# Altium footprint library Custom_Library.PcbLib: 221 footprints (part 4 of 14)
Each footprint in its own frame and in the unit in brackets; x right, y up, seen from the top. Pads: shape width x height; smd on the part's side, far side on the other; paste and mask are expansions set on the pad; w line width, h text height; cw(c..) or ccw(c..) is an arc to the next point about the centre after c.
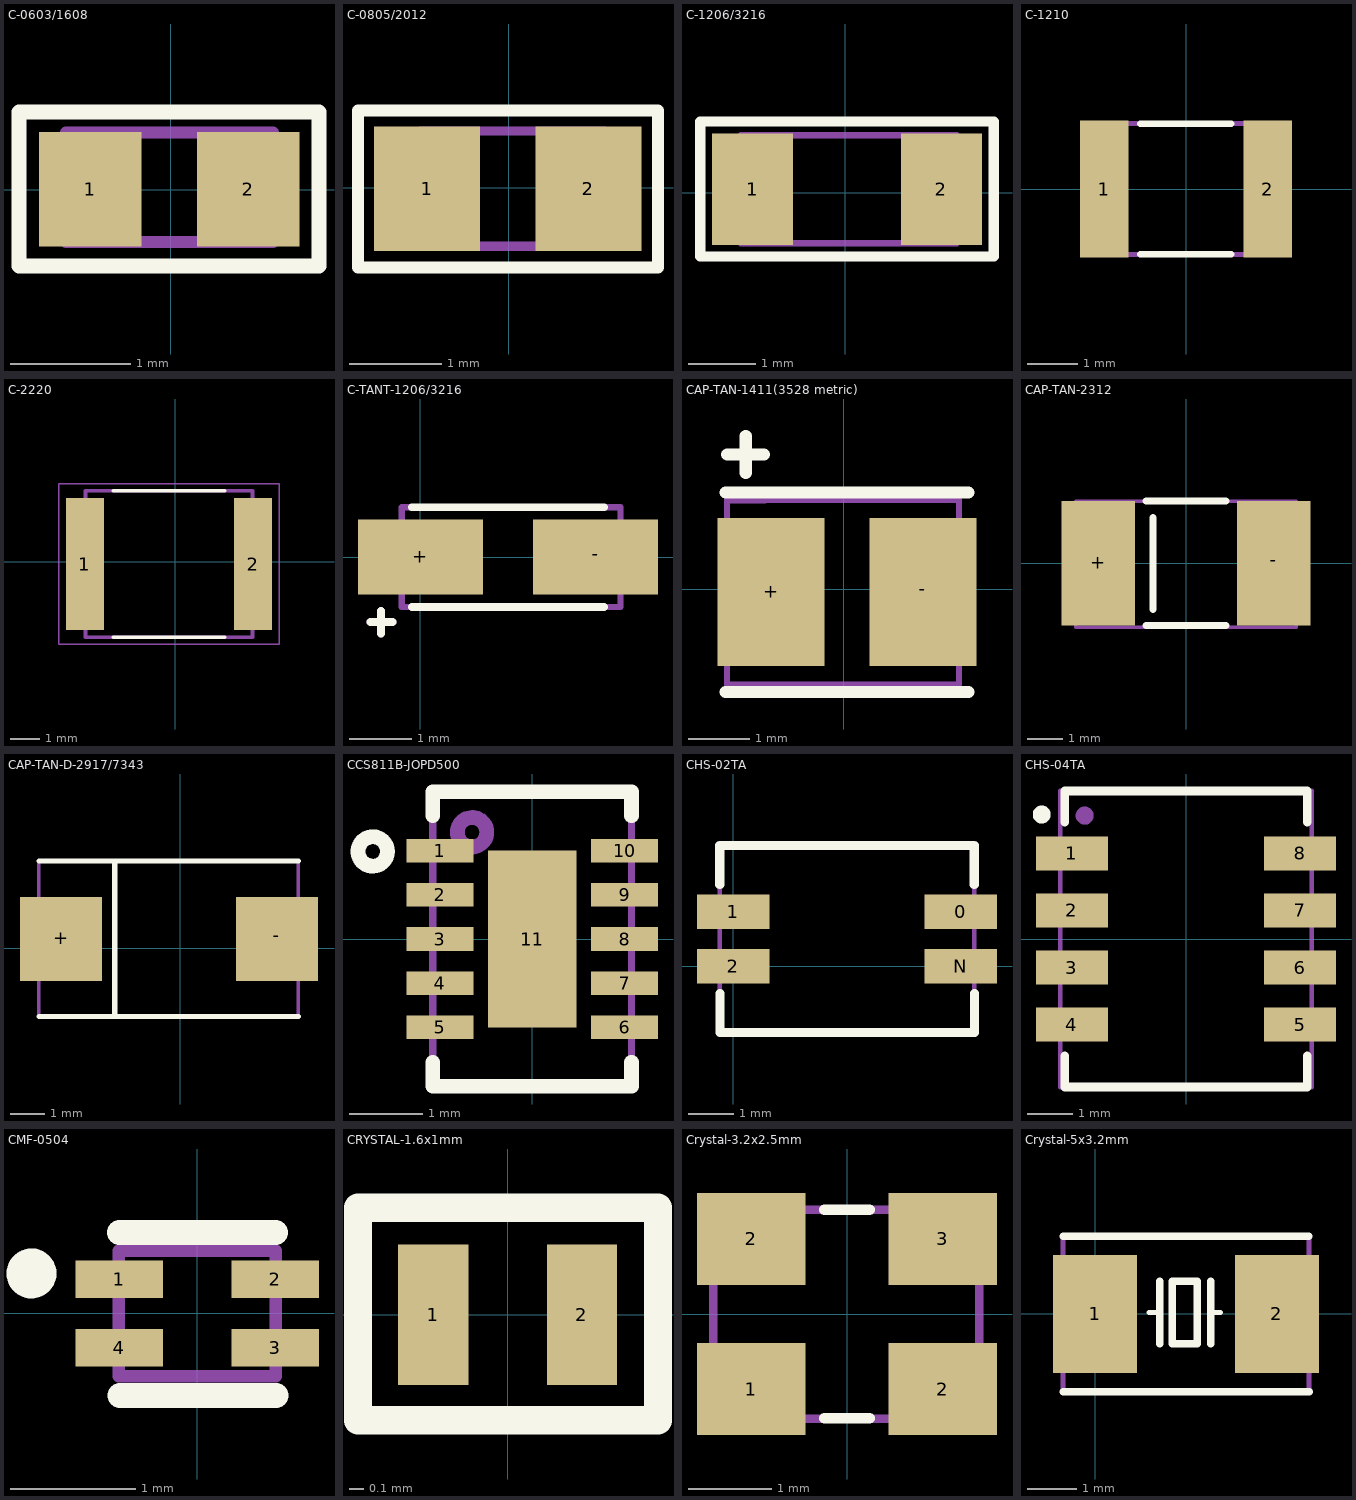
[diagram p3: the footprints below, top view; thin cyan lines are the x and y axes]

## C-0603/1608 [mm] "Chip Capacitor, 2-Leads, Body 1.60x0.80mm, IPC Medium Density"
height 0.89
pads (2):
  rect 0.85x0.95 smd: 1(-0.667,0.005) 2(0.643,0.005)
Top Overlay:
  lines w0.127: -1.258,-0.631 -1.258,0.645 1.23,0.645 1.23,-0.631 -1.258,-0.631
Top Assembly:
  lines w0.1: -0.868,-0.431 0.85,-0.431 0.85,0.475 -0.809,0.475 -0.868,0.475 -0.868,-0.431
  text "'.Designator'" at -3.12,-1.838 h1.27
3D body "0603 cap.STEP": height 0.82, standoff 0, extent -0.803,-0.402 0.797,0.422

## C-0805/2012 [mm] "Chip Capacitor, 2-Leads, Body 2.00x1.20mm, IPC Medium Density"
height 1.15
pads (2):
  rect 1.15x1.35 smd: 1(-0.883,-0.009) 2(0.867,-0.009)
Top Overlay:
  lines w0.127: -1.632,-0.864 1.621,-0.864 1.621,0.838 -1.632,0.838 -1.632,-0.633 -1.632,-0.864
Top Assembly:
  lines w0.1: -0.958,-0.634 1.042,-0.634 1.042,0.616 -0.958,0.616 -0.958,-0.634
  text "'.Designator'" at -2.987,-1.896 h1.27
3D body "0805 cap.STEP": height 1.26, standoff -0.02, extent -1.02,-0.644 0.98,0.63

## C-1206/3216 [mm] "Chip Capacitor, 2-Leads, Body 3.25x1.60mm, IPC Medium Density"
height 1.6
pads (2):
  rect 1.2x1.65 smd: 1(-1.373,0.055) 2(1.427,0.055)
Top Overlay:
  lines w0.15: -2.15,-0.94 -2.15,0.714 -2.15,1.058 2.203,1.058 2.203,-0.94 -2.15,-0.94
Top Assembly:
  lines w0.1: -1.548,-0.745 -1.548,0.855 1.652,0.855 1.652,-0.745 -1.548,-0.745
  text "'.Designator'" at -3.2,1.45 h1.27
3D body "1206 cap.STEP": height 1.62, standoff 0, extent -1.59,-0.762 1.61,0.862

## C-1210 [mm]
pads (2):
  rect 0.96x2.72 smd: 1(-1.625,0) 2(1.625,0)
Top Overlay:
  lines w0.127: -0.914,-1.3 0.599,-1.3 0.9,-1.3 ; -0.914,1.3 0.9,1.3
Top Assembly:
  lines w0.1: -1.7,-1.3 -1.7,1.3 -1,1.3 1.7,1.3 1.7,-1.3 -1.7,-1.3
  text "'.Designator'" at -3.356,-2.788 h1.27
3D body "CAP1210.STEP": height 1.5, standoff 0, extent -1.7,-1.3 1.7,1.3

## C-2220 [mm]
pads (2):
  rect 1.3x4.5 smd: 1(-3.087,-0.081) 2(2.663,-0.081)
Top Overlay:
  lines w0.127: -2.117,-2.581 1.693,-2.581 ; -2.117,2.419 1.693,2.419
Mechanical 13:
  lines w0.127: -3.062,-2.581 2.638,-2.581 2.638,2.419 -3.062,2.419 -3.062,-2.581
Mechanical 15:
  lines w0.05: -3.987,-2.831 3.563,-2.831 3.563,2.669 -3.987,2.669 -3.987,-2.831
3D body "step_temp.STEP": height 2.5, standoff 0, extent -3.062,-2.581 2.638,2.419

## C-TANT-1206/3216 [mm]
pads (2):
  rect 2x1.2 smd: +(0,0) -(2.8,0)
Top Overlay:
  lines w0.127: -0.8,-1.04 -0.45,-1.04 ; -0.63,-1.22 -0.63,-0.86 ; -0.135,-0.798 2.935,-0.798 ; -0.135,0.798 2.935,0.798
Top Assembly:
  lines w0.1: -0.3,-0.8 3.2,-0.8 3.2,0.8 -0.3,0.8 -0.3,-0.8
  lines w0.127: -0.8,-1.04 -0.45,-1.04 ; -0.63,-1.22 -0.63,-0.86
  text "'.Designator'" at -1.602,-2.541 h1.27
3D body "tantalum 10uF.stp": height 1.6, standoff -0.1, extent -0.25,-0.78 3.15,0.82

## CAP-TAN-1411(3528 metric) [mil]
pads (2):
  rect 68.44x95 smd: +(-46.73,-1.81) -(50.83,-1.81)
Top Overlay:
  lines w7.87: -75.95,-65.81 80.05,-65.81 ; -75.95,62.19 80.05,62.19 ; -74.8,86.61 -51.18,86.61 ; -62.99,74.8 -62.99,98.43
Top Assembly:
  lines w3.94: -74.89,54.05 -74.89,57.2 -50.76,57.2 -50.67,57.28 73.86,57.28 73.86,-31.08 73.86,-61.11 -16.8,-61.11 -16.89,-61.02 -74.89,-61.02 -74.89,55.03 ; -58.55,-1.81 -34.92,-1.81 ; -46.73,-13.62 -46.73,10
  text "'.Designator'" at -119.5,-119.24 h50
3D body: height 10, standoff 0, extent 2.05,-1.81 12.05,8.19
3D body "TCJB_AVX.step": height 85, standoff 0, extent -72.99,-60.59 72.99,57.44

## CAP-TAN-2312 [mm]
pads (2):
  rect 2.07x3.51 smd: +(-2.471,0) -(2.471,0)
Top Overlay:
  lines w0.2: -1.12,-1.75 1.12,-1.75 ; -1.12,1.75 1.12,1.75 ; -0.932,-1.307 -0.932,1.293
Top Assembly:
  lines w0.1: -1.257,1.742 3.1,1.742 3.1,-1.8 -3.1,-1.8 -3.1,1.742 -1.2,1.742
  text "'.Designator'" at -3.022,-3.609 h1.27
3D body "t491c106m025at.stp": height 2.81, standoff 0.01, extent -3.126,-1.746 3.174,1.754

## CAP-TAN-D-2917/7343 [mm]
pads (2):
  rect 2.37x2.43 smd mask+0.05: +(-3.44,0.27) -(2.8,0.27)
Top Overlay:
  lines w0.15: -4.08,-1.97 3.42,-1.97 ; -4.08,2.52 3.42,2.52 ; -1.89,-1.95 -1.89,2.52 -1.79,2.52
Top Assembly:
  lines w0.1: -4.09,-1.98 -4.09,2.52 3.41,2.52 3.41,-1.98 -4.04,-1.98 ; -3.75,0.31 -3.27,0.31 ; -3.51,0.07 -3.51,0.56
  text "'.Designator'" at -3.57,-3.19 h1.27
3D body "CAPM-TANTD-YL.STEP": height 3.11, standoff 0, extent -4.09,-1.98 3.41,2.52

## CCS811B-JOPD500 [mm]
pads (11):
  rect 0.91x0.32 smd: 1(-1.255,1.2) 2(-1.255,0.6) 3(-1.255,0) 4(-1.255,-0.6) 5(-1.255,-1.2) 6(1.255,-1.2) 7(1.255,-0.6) 8(1.255,0) 9(1.255,0.6) 10(1.255,1.2)
  rect 1.2x2.4 smd paste-2: 11(0,0)
Top Overlay:
  circle w0.2: c-2.166,1.189 r0.2
  lines w0.2: -1.35,-1.675 -1.35,-2 1.35,-2 1.35,-1.675 ; -1.35,1.675 -1.35,2 1.35,2 1.35,1.675
Top Paste:
  region: 0.37,0.075 -0.37,0.075 -0.37,1.045 0.37,1.045
  region: 0.37,-1.045 -0.37,-1.045 -0.37,-0.075 0.37,-0.075
Top Assembly:
  circle w0.2: c-0.816,1.451 r0.2
  lines w0.1: -1.35,-2 1.35,-2 1.35,2 -1.35,2 -1.35,-2
3D body: height 1.1, standoff 0, extent -1.35,-2 1.35,2

## CHS-02TA [mm]
pads (4):
  rect 1.6x0.76 smd mask+0.05: 0(5,1.2) 1(0,1.2) 2(0,0) N(5,0)
Top Overlay:
  lines w0.2: -0.3,1.8 -0.3,2.659 5.3,2.659 5.3,1.8 ; -0.298,-0.601 -0.298,-1.46 5.302,-1.46 5.302,-0.601
Top Assembly:
  lines w0.1: -0.3,-1.46 5.3,-1.46 5.3,2.659 3.086,2.659 -0.3,2.659 -0.3,-1.46
  text "'.Designator'" at -0.653,-2.842 h1.27
3D body "CHS-02TA.stp": height 2.52, standoff 0, extent -0.301,-1.442 5.299,2.658

## CHS-04TA [mm]
pads (8):
  rect 1.6x0.76 smd: 1(-2.54,1.905) 2(-2.54,0.635) 3(-2.54,-0.635) 4(-2.54,-1.905) 5(2.54,-1.905) 6(2.54,-0.635) 7(2.54,0.635) 8(2.54,1.905)
Top Overlay:
  circle w0.2: c-3.212,2.771 r0.1
  lines w0.2: -2.7,-2.605 -2.7,-3.3 2.7,-3.3 2.7,-2.605 ; -2.7,2.605 -2.7,3.3 2.7,3.3 2.7,2.605
Top Assembly:
  circle w0.2: c-2.255,2.747 r0.1
  lines w0.1: -2.798,-3.3 -2.798,1.213 -2.798,3.3 -2.7,3.3 2.798,3.3 2.798,-2.544 2.798,-3.3 -2.069,-3.3 -2.798,-3.3
  text "'.Designator'" at -3.73,-4.642 h1.27
3D body "CHS-04TA--3DModel-STEP-56544.STEP": height 2.5, standoff 0, extent -2.8,-3.3 2.8,3.3

## CMF-0504 [mm]
pads (4):
  rect 0.7x0.3 smd: 1(-0.625,0.275) 2(0.625,0.275) 3(0.625,-0.275) 4(-0.625,-0.275)
Top Overlay:
  circle w0.2: c-1.329,0.321 r0.1
  lines w0.2: -0.625,0.65 0.625,0.65 ; -0.618,-0.659 0.632,-0.659
Top Assembly:
  circle w0.1: c-0.41,0.255 r0.05
  lines w0.1: -0.631,-0.501 0.627,-0.501 0.627,0.501 0.001,0.501 -0.631,0.501 -0.631,-0.501
  text "'.Designator'" at -3.099,-1.67 h1.27
3D body "step_temp.STEP": height 0.92, standoff 0, extent -0.625,-0.5 0.625,0.5

## CRYSTAL-1.6x1mm [mm]
pads (2):
  rect 0.5x1 smd: 1(-0.53,0) 2(0.53,0)
Top Overlay:
  lines w0.2: -1.066,-0.753 -1.066,0.762 -0.889,0.762 1.072,0.762 1.072,-0.753 -1.066,-0.753

## Crystal-3.2x2.5mm [mm]
pads (4):
  rect 1.3x1.1 smd: 1(-1.15,-0.9) 2(-1.15,0.9) 2(1.15,-0.9) 3(1.15,0.9)
Top Overlay:
  lines w0.127: -0.27,-1.25 0.27,-1.25 ; -0.27,1.25 0.27,1.25
Top Assembly:
  lines w0.1: -1.607,-1.257 -1.607,0.146 -1.607,1.251 1.586,1.251 1.586,-1.257 -1.607,-1.257
  text "'.Designator'" at -3.496,-2.581 h1.27
3D body "ECS-160-9-33B-CWN-TR.STEP": height 0.8, standoff 0, extent -1.6,-1.25 1.6,1.25

## Crystal-5x3.2mm [mm] "HC49UP"
pads (2):
  rect 1.7x2.4 smd: 1(0,0) 2(3.7,0)
Top Overlay:
  lines w0.1: 1.1,0.034 1.317,0.034 ; 2.35,0.034 2.55,0.034
  lines w0.15: -0.651,1.581 4.349,1.581 ; -0.647,-1.582 4.353,-1.582
  lines w0.152: 1.317,-0.601 1.317,0.034 1.317,0.669 ; 2.35,-0.601 2.35,0.034 2.35,0.669 ; 1.575,-0.601 1.575,0.669 2.083,0.669 2.083,-0.601 1.575,-0.601
Top Assembly:
  lines w0.1: -0.65,-1.6 -0.65,1.6 4.35,1.6 4.35,-1.6 -0.65,-1.6
  text "'.Designator'" at -3.1,-3.3 h2
3D body "Xtal_Smd_HCX-6FA.STEP": height 1.22, standoff -0.03, extent -0.65,-1.6 4.35,1.6